# Altium footprint library Reflow3D1411sep.PcbLib: 657 footprints (part 13 of 42)
Each footprint in its own frame and in the unit in brackets; x right, y up, seen from the top. Pads: shape width x height; smd on the part's side, far side on the other; paste and mask are expansions set on the pad; w line width, h text height; cw(c..) or ccw(c..) is an arc to the next point about the centre after c.
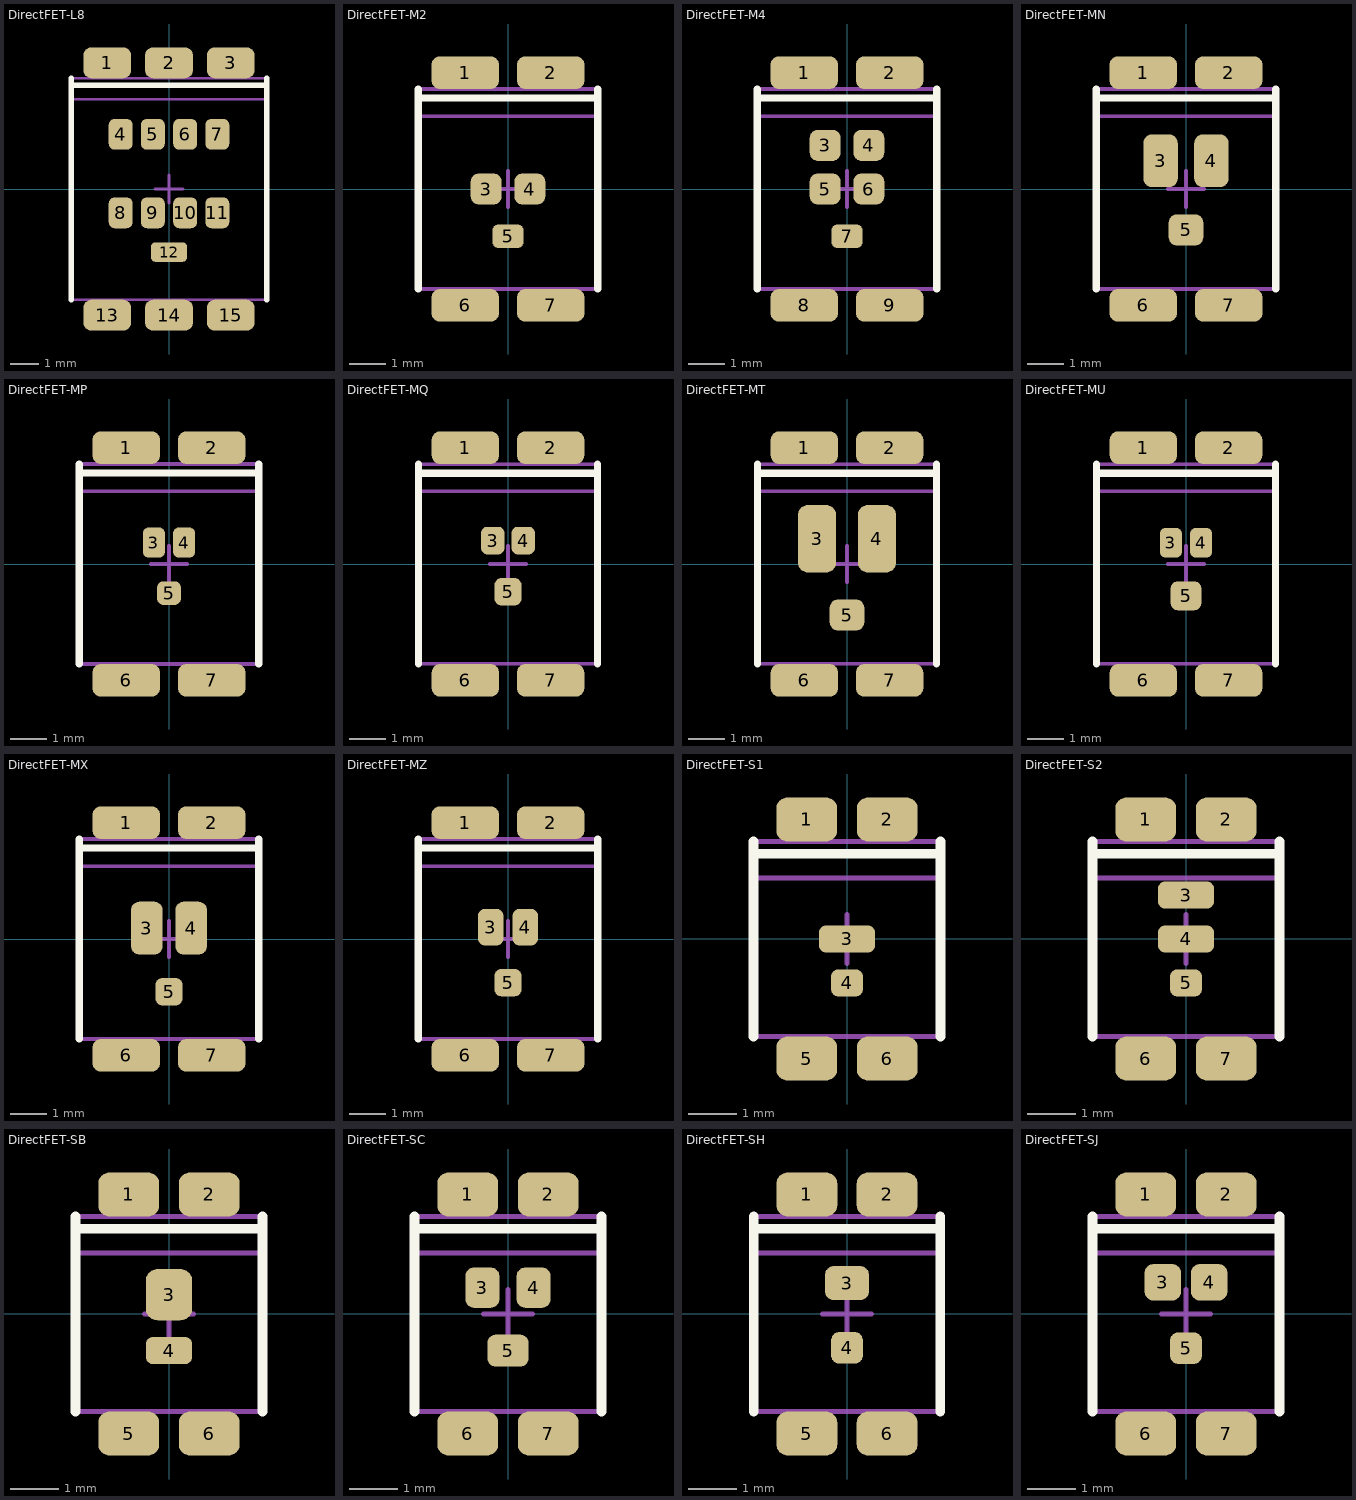
[diagram p12: the footprints below, top view; thin cyan lines are the x and y axes]

## DirectFET-L8 [mm] "www.irf.com, L8-Outline.pdf, an-1035.pdf"
height 0.71
pads (15):
  rrect50% 1.7x1.1 smd paste-25.4 mask+0: 1(-2.2,4.5) 2(0,4.5) 3(2.2,4.5) 13(-2.2,-4.5) 14(0,-4.5) 15(2.2,-4.5)
  rrect50% 0.85x1.1 smd paste-25.4 mask+0: 4(-1.725,1.95) 5(-0.575,1.95) 6(0.575,1.95) 7(1.725,1.95) 8(-1.725,-0.85) 9(-0.575,-0.85) 10(0.575,-0.85) 11(1.725,-0.85)
  rrect50% 1.3x0.7 smd paste-25.4 mask+0: 12(0,-2.25)
Top Overlay:
  lines w0.2: -3.49,-3.95 -3.49,3.95 ; -3.49,3.7 3.49,3.7 ; 3.49,-3.95 3.49,3.95
Top Paste:
  region: -0.925,-0.35 -0.925,-1.35 -0.225,-1.35 -0.225,-0.35
  region: -2.95,4.95 -2.95,4.05 -1.45,4.05 -1.45,4.95
  region: -0.75,4.95 -0.75,4.05 0.75,4.05 0.75,4.95
  region: 1.45,4.95 1.45,4.05 2.95,4.05 2.95,4.95
  region: 1.45,-4.05 1.45,-4.95 2.95,-4.95 2.95,-4.05
  region: -0.75,-4.05 -0.75,-4.95 0.75,-4.95 0.75,-4.05
  region: 0.225,-0.35 0.225,-1.35 0.925,-1.35 0.925,-0.35
  region: -2.95,-4.05 -2.95,-4.95 -1.45,-4.95 -1.45,-4.05
  region: -0.55,-1.935 -0.55,-2.565 0.55,-2.565 0.55,-1.935
  region: -0.925,2.45 -0.925,1.45 -0.225,1.45 -0.225,2.45
  region: 0.225,2.45 0.225,1.45 0.925,1.45 0.925,2.45
  region: -2.075,2.45 -2.075,1.45 -1.375,1.45 -1.375,2.45
  region: -2.075,-0.35 -2.075,-1.35 -1.375,-1.35 -1.375,-0.35
  region: 1.375,2.45 1.375,1.45 2.075,1.45 2.075,2.45
  region: 1.375,-0.35 1.375,-1.35 2.075,-1.35 2.075,-0.35
Mechanical 13:
  lines w0.1: -3.49,3.2 3.49,3.2 ; -3.49,-3.95 3.49,-3.95 3.49,3.95 -3.49,3.95 -3.49,-3.95
Mechanical 15:
  lines w0.1: -0.5,0 0.5,0 ; 0,-0.5 0,0.5
3D body: height 0.74, standoff 0, extent -3.55,-4.025 3.55,4.025

## DirectFET-M2 [mm] "www.irf.com, M2-Outline.pdf, an-1035.pdf"
height 0.71
pads (7):
  rrect50% 1.85x0.9 smd paste-25.4 mask+0: 1(-1.175,3.2) 2(1.175,3.2) 6(-1.175,-3.2) 7(1.175,-3.2)
  rrect50% 0.85x0.85 smd paste-25.4 mask+0: 3(-0.6,0) 4(0.6,0)
  rrect50% 0.85x0.65 smd paste-25.4 mask+0: 5(0,-1.3)
Top Overlay:
  lines w0.2: -2.465,-2.75 -2.465,2.75 ; -2.465,2.5 2.465,2.5 ; 2.465,-2.75 2.465,2.75
Top Paste:
  region: 0.225,0.375 0.225,-0.375 0.975,-0.375 0.975,0.375
  region: -0.35,-1 -0.35,-1.6 0.35,-1.6 0.35,-1
  region: -2.1,-2.85 -2.1,-3.55 -0.3,-3.55 -0.3,-2.85
  region: -0.975,0.375 -0.975,-0.375 -0.225,-0.375 -0.225,0.375
  region: 0.3,-2.85 0.3,-3.55 2.1,-3.55 2.1,-2.85
  region: 0.3,3.55 0.3,2.85 2.1,2.85 2.1,3.55
  region: -2.1,3.55 -2.1,2.85 -0.3,2.85 -0.3,3.55
Mechanical 13:
  lines w0.1: -2.465,2 2.465,2 ; -2.465,-2.75 2.465,-2.75 2.465,2.75 -2.465,2.75 -2.465,-2.75
Mechanical 15:
  lines w0.1: -0.5,0 0.5,0 ; 0,-0.5 0,0.5
3D body: height 0.74, standoff 0, extent -2.525,-2.825 2.525,2.825

## DirectFET-M4 [mm] "www.irf.com, M4-Outline.pdf, an-1035.pdf"
height 0.71
pads (9):
  rrect50% 1.85x0.9 smd paste-25.4 mask+0: 1(-1.175,3.2) 2(1.175,3.2) 8(-1.175,-3.2) 9(1.175,-3.2)
  rrect50% 0.85x0.85 smd paste-25.4 mask+0: 3(-0.6,1.2) 4(0.6,1.2) 5(-0.6,0) 6(0.6,0)
  rrect50% 0.85x0.65 smd paste-25.4 mask+0: 7(0,-1.3)
Top Overlay:
  lines w0.2: -2.465,-2.75 -2.465,2.75 ; -2.465,2.5 2.465,2.5 ; 2.465,-2.75 2.465,2.75
Top Paste:
  region: -2.1,3.55 -2.1,2.85 -0.3,2.85 -0.3,3.55
  region: 0.3,3.55 0.3,2.85 2.1,2.85 2.1,3.55
  region: 0.3,-2.85 0.3,-3.55 2.1,-3.55 2.1,-2.85
  region: -0.975,0.375 -0.975,-0.375 -0.225,-0.375 -0.225,0.375
  region: -2.1,-2.85 -2.1,-3.55 -0.3,-3.55 -0.3,-2.85
  region: -0.35,-1 -0.35,-1.6 0.35,-1.6 0.35,-1
  region: 0.225,0.375 0.225,-0.375 0.975,-0.375 0.975,0.375
  region: 0.225,1.575 0.225,0.825 0.975,0.825 0.975,1.575
  region: -0.975,1.575 -0.975,0.825 -0.225,0.825 -0.225,1.575
Mechanical 13:
  lines w0.1: -2.465,2 2.465,2 ; -2.465,-2.75 -2.465,2.75 2.465,2.75 2.465,-2.75 -2.465,-2.75
Mechanical 15:
  lines w0.1: -0.5,0 0.5,0 ; 0,-0.5 0,0.5
3D body: height 0.74, standoff 0, extent -2.525,-2.825 2.525,2.825

## DirectFET-MN [mm] "www.irf.com, MN-Outline.pdf, an-1035.pdf; www.infineon.com, MG-WDSON-2-MN-Package_Overview.pdf"
height 0.65
pads (7):
  rrect50% 1.85x0.9 smd paste-25.4 mask+0: 1(-1.175,3.2) 2(1.175,3.2) 6(-1.175,-3.2) 7(1.175,-3.2)
  rrect50% 0.95x1.45 smd paste-25.4 mask+0: 3(-0.7,0.775) 4(0.7,0.775)
  rrect50% 0.95x0.85 smd paste-25.4 mask+0: 5(0,-1.125)
Top Overlay:
  lines w0.2: -2.465,-2.75 -2.465,2.75 ; -2.465,2.5 2.465,2.5 ; 2.465,-2.75 2.465,2.75
Top Paste:
  region: -0.425,-0.75 -0.425,-1.45 0.425,-1.45 0.425,-0.75
  region: -2.1,-2.85 -2.1,-3.55 -0.3,-3.55 -0.3,-2.85
  region: 0.275,1.4 0.275,0.1 1.075,0.1 1.075,1.4
  region: 0.3,-2.85 0.3,-3.55 2.1,-3.55 2.1,-2.85
  region: 0.3,3.55 0.3,2.85 2.1,2.85 2.1,3.55
  region: -2.1,3.55 -2.1,2.85 -0.3,2.85 -0.3,3.55
  region: -1.075,1.4 -1.075,0.1 -0.275,0.1 -0.275,1.4
Mechanical 13:
  lines w0.1: -2.465,2 2.465,2 ; -2.465,-2.75 2.465,-2.75 2.465,2.75 -2.465,2.75 -2.465,-2.75
Mechanical 15:
  lines w0.1: -0.5,0 0.5,0 ; 0,-0.5 0,0.5
3D body: height 0.7, standoff 0, extent -2.525,-2.825 2.525,2.825

## DirectFET-MP [mm] "www.irf.com, MP-Outline.pdf, an-1035.pdf; www.infineon.com, MG-WDSON-2-MP-Package_Overview.pdf"
height 0.65
pads (7):
  rrect50% 1.85x0.9 smd paste-25.4 mask+0: 1(-1.175,3.2) 2(1.175,3.2) 6(-1.175,-3.2) 7(1.175,-3.2)
  rrect50% 0.6x0.825 smd paste-25.4 mask+0: 3(-0.415,0.59) 4(0.415,0.59)
  rrect50% 0.65x0.65 smd paste-25.4 mask+0: 5(0,-0.8)
Top Overlay:
  lines w0.2: -2.465,-2.75 -2.465,2.75 ; -2.465,2.5 2.465,2.5 ; 2.465,-2.75 2.465,2.75
Top Paste:
  region: 0.165,0.955 0.165,0.225 0.665,0.225 0.665,0.955
  region: -2.1,3.55 -2.1,2.85 -0.3,2.85 -0.3,3.55
  region: 0.3,3.55 0.3,2.85 2.1,2.85 2.1,3.55
  region: 0.3,-2.85 0.3,-3.55 2.1,-3.55 2.1,-2.85
  region: -2.1,-2.85 -2.1,-3.55 -0.3,-3.55 -0.3,-2.85
  region: -0.275,-0.525 -0.275,-1.075 0.275,-1.075 0.275,-0.525
  region: -0.665,0.955 -0.665,0.225 -0.165,0.225 -0.165,0.955
Mechanical 13:
  lines w0.1: -2.465,2 2.465,2 ; -2.465,-2.75 -2.465,2.75 2.465,2.75 2.465,-2.75 -2.465,-2.75
Mechanical 15:
  lines w0.1: -0.5,0 0.5,0 ; 0,-0.5 0,0.5
3D body: height 0.7, standoff 0, extent -2.525,-2.825 2.525,2.825

## DirectFET-MQ [mm] "www.irf.com, MQ-Outline.pdf, an-1035.pdf"
height 0.65
pads (7):
  rrect50% 1.85x0.9 smd paste-25.4 mask+0: 1(-1.175,3.205) 2(1.175,3.205) 6(-1.175,-3.205) 7(1.175,-3.205)
  rrect50% 0.64x0.76 smd paste-25.4 mask+0: 3(-0.42,0.645) 4(0.42,0.645)
  rrect50% 0.75x0.75 smd paste-25.4 mask+0: 5(0,-0.765)
Top Overlay:
  lines w0.2: -2.465,-2.75 -2.465,2.75 ; -2.465,2.5 2.465,2.5 ; 2.465,-2.75 2.465,2.75
Top Paste:
  region: -0.675,0.95 -0.675,0.3 -0.125,0.3 -0.125,0.95
  region: -2.1,3.55 -2.1,2.85 -0.3,2.85 -0.3,3.55
  region: 0.3,3.55 0.3,2.85 2.1,2.85 2.1,3.55
  region: 0.3,-2.85 0.3,-3.55 2.1,-3.55 2.1,-2.85
  region: -2.1,-2.85 -2.1,-3.55 -0.3,-3.55 -0.3,-2.85
  region: -0.325,-0.45 -0.325,-1.1 0.325,-1.1 0.325,-0.45
  region: 0.125,0.95 0.125,0.3 0.675,0.3 0.675,0.95
Mechanical 13:
  lines w0.1: -2.465,2 2.465,2 ; -2.465,-2.75 -2.465,2.75 2.465,2.75 2.465,-2.75 -2.465,-2.75
Mechanical 15:
  lines w0.1: -0.5,0 0.5,0 ; 0,-0.5 0,0.5
3D body: height 0.7, standoff 0, extent -2.525,-2.825 2.525,2.825

## DirectFET-MT [mm] "www.irf.com, MT-Outline.pdf, an-1035.pdf"
height 0.65
pads (7):
  rrect50% 1.85x0.9 smd paste-25.4 mask+0: 1(-1.175,3.205) 2(1.175,3.205) 6(-1.175,-3.205) 7(1.175,-3.205)
  rrect50% 1.05x1.85 smd paste-25.4 mask+0: 3(-0.825,0.695) 4(0.825,0.695)
  rrect50% 0.95x0.85 smd paste-25.4 mask+0: 5(0,-1.405)
Top Overlay:
  lines w0.2: -2.465,-2.75 -2.465,2.75 ; -2.465,2.5 2.465,2.5 ; 2.465,-2.75 2.465,2.75
Top Paste:
  region: -1.225,1.55 -1.225,-0.15 -0.375,-0.15 -0.375,1.55
  region: 0.375,1.55 0.375,-0.15 1.225,-0.15 1.225,1.55
  region: -0.425,-1.05 -0.425,-1.75 0.425,-1.75 0.425,-1.05
  region: -2.1,-2.85 -2.1,-3.55 -0.3,-3.55 -0.3,-2.85
  region: 0.3,-2.85 0.3,-3.55 2.1,-3.55 2.1,-2.85
  region: 0.3,3.55 0.3,2.85 2.1,2.85 2.1,3.55
  region: -2.1,3.55 -2.1,2.85 -0.3,2.85 -0.3,3.55
Mechanical 13:
  lines w0.1: -2.465,2 2.465,2 ; -2.465,-2.75 2.465,-2.75 2.465,2.75 -2.465,2.75 -2.465,-2.75
Mechanical 15:
  lines w0.1: -0.5,0 0.5,0 ; 0,-0.5 0,0.5
3D body: height 0.7, standoff 0, extent -2.525,-2.825 2.525,2.825

## DirectFET-MU [mm] "www.irf.com, MU-Outline.pdf, an-1035.pdf"
height 0.65
pads (7):
  rrect50% 1.85x0.9 smd paste-25.4 mask+0: 1(-1.175,3.205) 2(1.175,3.205) 6(-1.175,-3.205) 7(1.175,-3.205)
  rrect50% 0.6x0.82 smd paste-25.4 mask+0: 3(-0.415,0.585) 4(0.415,0.585)
  rrect50% 0.85x0.8 smd paste-25.4 mask+0: 5(0,-0.875)
Top Overlay:
  lines w0.2: -2.465,-2.75 -2.465,2.75 ; -2.465,2.5 2.465,2.5 ; 2.465,-2.75 2.465,2.75
Top Paste:
  region: -2.1,3.555 -2.1,2.855 -0.3,2.855 -0.3,3.555
  region: 0.3,3.555 0.3,2.855 2.1,2.855 2.1,3.555
  region: 0.3,-2.855 0.3,-3.555 2.1,-3.555 2.1,-2.855
  region: -2.1,-2.855 -2.1,-3.555 -0.3,-3.555 -0.3,-2.855
  region: -0.365,-0.525 -0.365,-1.225 0.365,-1.225 0.365,-0.525
  region: 0.15,0.935 0.15,0.235 0.68,0.235 0.68,0.935
  region: -0.68,0.935 -0.68,0.235 -0.15,0.235 -0.15,0.935
Mechanical 13:
  lines w0.1: -2.465,2 2.465,2 ; -2.465,-2.75 -2.465,2.75 2.465,2.75 2.465,-2.75 -2.465,-2.75
Mechanical 15:
  lines w0.1: -0.5,0 0.5,0 ; 0,-0.5 0,0.5
3D body: height 0.7, standoff 0, extent -2.525,-2.825 2.525,2.825

## DirectFET-MX [mm] "www.irf.com, MX-Outline.pdf, an-1035.pdf; www.infineon.com, MG-WDSON-2-MX-Package_Overview.pdf"
height 0.65
pads (7):
  rrect50% 1.85x0.9 smd paste-25.4 mask+0: 1(-1.175,3.2) 2(1.175,3.2) 6(-1.175,-3.2) 7(1.175,-3.2)
  rrect50% 0.87x1.45 smd paste-25.4 mask+0: 3(-0.61,0.3) 4(0.61,0.3)
  rrect50% 0.75x0.75 smd paste-25.4 mask+0: 5(0,-1.45)
Top Overlay:
  lines w0.2: -2.465,-2.75 -2.465,2.75 ; -2.465,2.5 2.465,2.5 ; 2.465,-2.75 2.465,2.75
Top Paste:
  region: 0.235,0.925 0.235,-0.325 0.985,-0.325 0.985,0.925
  region: -2.1,3.55 -2.1,2.85 -0.3,2.85 -0.3,3.55
  region: 0.3,3.55 0.3,2.85 2.1,2.85 2.1,3.55
  region: 0.3,-2.85 0.3,-3.55 2.1,-3.55 2.1,-2.85
  region: -2.1,-2.85 -2.1,-3.55 -0.3,-3.55 -0.3,-2.85
  region: -0.325,-1.125 -0.325,-1.775 0.325,-1.775 0.325,-1.125
  region: -0.985,0.925 -0.985,-0.325 -0.235,-0.325 -0.235,0.925
Mechanical 13:
  lines w0.1: -2.465,2 2.465,2 ; -2.465,-2.75 -2.465,2.75 2.465,2.75 2.465,-2.75 -2.465,-2.75
Mechanical 15:
  lines w0.1: -0.5,0 0.5,0 ; 0,-0.5 0,0.5
3D body: height 0.7, standoff 0, extent -2.525,-2.825 2.525,2.825

## DirectFET-MZ [mm] "www.irf.com, MZ-Outline.pdf, an-1035.pdf; www.infineon.com, MG-WDSON-2-MZ-Package_Overview.pdf"
height 0.65
pads (7):
  rrect50% 1.85x0.9 smd paste-25.4 mask+0: 1(-1.175,3.2) 2(1.175,3.2) 6(-1.175,-3.2) 7(1.175,-3.2)
  rrect50% 0.7x1 smd paste-25.4 mask+0: 3(-0.475,0.325) 4(0.475,0.325)
  rrect50% 0.75x0.75 smd paste-25.4 mask+0: 5(0,-1.2)
Top Overlay:
  lines w0.2: -2.465,-2.75 -2.465,2.75 ; -2.465,2.5 2.465,2.5 ; 2.465,-2.75 2.465,2.75
Top Paste:
  region: -0.775,0.775 -0.775,-0.125 -0.175,-0.125 -0.175,0.775
  region: -0.325,-0.875 -0.325,-1.525 0.325,-1.525 0.325,-0.875
  region: -2.1,-2.85 -2.1,-3.55 -0.3,-3.55 -0.3,-2.85
  region: 0.3,-2.85 0.3,-3.55 2.1,-3.55 2.1,-2.85
  region: 0.3,3.55 0.3,2.85 2.1,2.85 2.1,3.55
  region: -2.1,3.55 -2.1,2.85 -0.3,2.85 -0.3,3.55
  region: 0.175,0.775 0.175,-0.125 0.775,-0.125 0.775,0.775
Mechanical 13:
  lines w0.1: -2.465,2 2.465,2 ; -2.465,-2.75 2.465,-2.75 2.465,2.75 -2.465,2.75 -2.465,-2.75
Mechanical 15:
  lines w0.1: -0.5,0 0.5,0 ; 0,-0.5 0,0.5
3D body: height 0.7, standoff 0, extent -2.525,-2.825 2.525,2.825

## DirectFET-S1 [mm] "www.irf.com, S1-Outline.pdf, an-1035.pdf"
height 0.71
pads (6):
  rrect50% 1.25x0.9 smd paste-25.4 mask+0: 1(-0.825,2.45) 2(0.825,2.45) 5(-0.825,-2.45) 6(0.825,-2.45)
  rrect50% 1.15x0.55 smd paste-25.4 mask+0: 3(0,0)
  rrect50% 0.65x0.55 smd paste-25.4 mask+0: 4(0,-0.9)
Top Overlay:
  lines w0.2: -1.915,-2 -1.915,2 ; -1.915,1.75 1.915,1.75 ; 1.915,-2 1.915,2
Top Paste:
  region: -0.29,-0.66 -0.29,-1.14 0.29,-1.14 0.29,-0.66
  region: -1.45,2.8 -1.45,2.1 -0.25,2.1 -0.25,2.8
  region: 0.25,2.8 0.25,2.1 1.45,2.1 1.45,2.8
  region: 0.25,-2.1 0.25,-2.8 1.45,-2.8 1.45,-2.1
  region: -1.45,-2.1 -1.45,-2.8 -0.25,-2.8 -0.25,-2.1
  region: -0.525,0.225 -0.525,-0.225 0.525,-0.225 0.525,0.225
Mechanical 13:
  lines w0.1: -1.915,1.25 1.915,1.25 ; -1.915,-2 1.915,-2 1.915,2 -1.915,2 -1.915,-2
Mechanical 15:
  lines w0.1: -0.5,0 0.5,0 ; 0,-0.5 0,0.5
3D body: height 0.74, standoff 0, extent -1.975,-2.075 1.975,2.075

## DirectFET-S2 [mm] "www.irf.com, S2-Outline.pdf, an-1035.pdf"
height 0.71
pads (7):
  rrect50% 1.25x0.9 smd paste-25.4 mask+0: 1(-0.825,2.45) 2(0.825,2.45) 6(-0.825,-2.45) 7(0.825,-2.45)
  rrect50% 1.15x0.55 smd paste-25.4 mask+0: 3(0,0.9) 4(0,0)
  rrect50% 0.65x0.55 smd paste-25.4 mask+0: 5(0,-0.9)
Top Overlay:
  lines w0.2: -1.915,-2 -1.915,2 ; -1.915,1.75 1.915,1.75 ; 1.915,-2 1.915,2
Top Paste:
  region: -0.525,1.125 -0.525,0.675 0.525,0.675 0.525,1.125
  region: -0.29,-0.66 -0.29,-1.14 0.29,-1.14 0.29,-0.66
  region: -1.45,2.8 -1.45,2.1 -0.25,2.1 -0.25,2.8
  region: 0.25,2.8 0.25,2.1 1.45,2.1 1.45,2.8
  region: 0.25,-2.1 0.25,-2.8 1.45,-2.8 1.45,-2.1
  region: -1.45,-2.1 -1.45,-2.8 -0.25,-2.8 -0.25,-2.1
  region: -0.525,0.225 -0.525,-0.225 0.525,-0.225 0.525,0.225
Mechanical 13:
  lines w0.1: -1.915,1.25 1.915,1.25 ; -1.915,-2 1.915,-2 1.915,2 -1.915,2 -1.915,-2
Mechanical 15:
  lines w0.1: -0.5,0 0.5,0 ; 0,-0.5 0,0.5
3D body: height 0.74, standoff 0, extent -1.975,-2.075 1.975,2.075

## DirectFET-SB [mm] "www.irf.com, SB-Outline.pdf, an-1035.pdf"
height 0.71
pads (6):
  rrect50% 1.25x0.9 smd paste-25.4 mask+0: 1(-0.825,2.45) 2(0.825,2.45) 5(-0.825,-2.45) 6(0.825,-2.45)
  rrect50% 0.95x1.05 smd paste-25.4 mask+0: 3(0,0.395)
  rrect50% 0.95x0.55 smd paste-25.4 mask+0: 4(0,-0.75)
Top Overlay:
  lines w0.2: -1.915,-2 -1.915,2 ; -1.915,1.75 1.915,1.75 ; 1.915,-2 1.915,2
Top Paste:
  region: -0.39,-0.5 -0.39,-1 0.39,-1 0.39,-0.5
  region: -1.45,2.8 -1.45,2.1 -0.25,2.1 -0.25,2.8
  region: 0.25,2.8 0.25,2.1 1.45,2.1 1.45,2.8
  region: 0.25,-2.1 0.25,-2.8 1.45,-2.8 1.45,-2.1
  region: -1.45,-2.1 -1.45,-2.8 -0.25,-2.8 -0.25,-2.1
  region: -0.39,0.885 -0.39,-0.095 0.39,-0.095 0.39,0.885
Mechanical 13:
  lines w0.1: -1.915,1.25 1.915,1.25 ; -1.915,-2 1.915,-2 1.915,2 -1.915,2 -1.915,-2
Mechanical 15:
  lines w0.1: -0.5,0 0.5,0 ; 0,-0.5 0,0.5
3D body: height 0.74, standoff 0, extent -1.975,-2.075 1.975,2.075

## DirectFET-SC [mm] "www.irf.com, SC-Outline.pdf, an-1035.pdf"
height 0.71
pads (7):
  rrect50% 1.25x0.9 smd paste-25.4 mask+0: 1(-0.825,2.45) 2(0.825,2.45) 6(-0.825,-2.45) 7(0.825,-2.45)
  rrect50% 0.7x0.825 smd paste-25.4 mask+0: 3(-0.525,0.54) 4(0.525,0.54)
  rrect50% 0.85x0.65 smd paste-25.4 mask+0: 5(0,-0.75)
Top Overlay:
  lines w0.2: -1.915,-2 -1.915,2 ; -1.915,1.75 1.915,1.75 ; 1.915,-2 1.915,2
Top Paste:
  region: 0.225,0.89 0.225,0.19 0.825,0.19 0.825,0.89
  region: -0.825,0.89 -0.825,0.19 -0.225,0.19 -0.225,0.89
  region: -0.375,-0.475 -0.375,-1.025 0.375,-1.025 0.375,-0.475
  region: -1.45,2.8 -1.45,2.1 -0.25,2.1 -0.25,2.8
  region: 0.25,2.8 0.25,2.1 1.45,2.1 1.45,2.8
  region: 0.25,-2.1 0.25,-2.8 1.45,-2.8 1.45,-2.1
  region: -1.45,-2.1 -1.45,-2.8 -0.25,-2.8 -0.25,-2.1
Mechanical 13:
  lines w0.1: -1.915,1.25 1.915,1.25 ; -1.915,-2 1.915,-2 1.915,2 -1.915,2 -1.915,-2
Mechanical 15:
  lines w0.1: -0.5,0 0.5,0 ; 0,-0.5 0,0.5
3D body: height 0.74, standoff 0, extent -1.975,-2.075 1.975,2.075

## DirectFET-SH [mm] "www.irf.com, SH-Outline.pdf, an-1035.pdf"
height 0.65
pads (6):
  rrect50% 1.25x0.9 smd paste-25.4 mask+0: 1(-0.825,2.455) 2(0.825,2.455) 5(-0.825,-2.455) 6(0.825,-2.455)
  rrect50% 0.9x0.7 smd paste-25.4 mask+0: 3(0,0.635)
  rrect50% 0.65x0.65 smd paste-25.4 mask+0: 4(0,-0.695)
Top Overlay:
  lines w0.2: -1.915,-2 -1.915,2 ; -1.915,1.75 1.915,1.75 ; 1.915,-2 1.915,2
Top Paste:
  region: -1.45,-2.105 -1.45,-2.805 -0.25,-2.805 -0.25,-2.105
  region: 0.25,-2.105 0.25,-2.805 1.45,-2.805 1.45,-2.105
  region: 0.25,2.805 0.25,2.105 1.45,2.105 1.45,2.805
  region: -1.45,2.805 -1.45,2.105 -0.25,2.105 -0.25,2.805
  region: -0.325,-0.445 -0.325,-0.945 0.325,-0.945 0.325,-0.445
  region: -0.4,0.935 -0.4,0.335 0.4,0.335 0.4,0.935
Mechanical 13:
  lines w0.1: -1.915,1.25 1.915,1.25 ; -1.915,-2 -1.915,2 1.915,2 1.915,-2 -1.915,-2
Mechanical 15:
  lines w0.1: -0.5,0 0.5,0 ; 0,-0.5 0,0.5
3D body: height 0.7, standoff 0, extent -1.975,-2.075 1.975,2.075

## DirectFET-SJ [mm] "www.irf.com, SJ-Outline.pdf, an-1035.pdf"
height 0.65
pads (7):
  rrect50% 1.25x0.9 smd paste-25.4 mask+0: 1(-0.825,2.45) 2(0.825,2.45) 6(-0.825,-2.45) 7(0.825,-2.45)
  rrect50% 0.75x0.75 smd paste-25.4 mask+0: 3(-0.475,0.65) 4(0.475,0.65)
  rrect50% 0.65x0.65 smd paste-25.4 mask+0: 5(0,-0.7)
Top Overlay:
  lines w0.2: -1.915,-2 -1.915,2 ; -1.915,1.75 1.915,1.75 ; 1.915,-2 1.915,2
Top Paste:
  region: 0.15,0.975 0.15,0.325 0.8,0.325 0.8,0.975
  region: -1.45,-2.1 -1.45,-2.8 -0.25,-2.8 -0.25,-2.1
  region: 0.25,-2.1 0.25,-2.8 1.45,-2.8 1.45,-2.1
  region: 0.25,2.8 0.25,2.1 1.45,2.1 1.45,2.8
  region: -1.45,2.8 -1.45,2.1 -0.25,2.1 -0.25,2.8
  region: -0.29,-0.425 -0.29,-0.975 0.29,-0.975 0.29,-0.425
  region: -0.8,0.975 -0.8,0.325 -0.15,0.325 -0.15,0.975
Mechanical 13:
  lines w0.1: -1.915,1.25 1.915,1.25 ; -1.915,-2 -1.915,2 1.915,2 1.915,-2 -1.915,-2
Mechanical 15:
  lines w0.1: -0.5,0 0.5,0 ; 0,-0.5 0,0.5
3D body: height 0.7, standoff 0, extent -1.975,-2.075 1.975,2.075